# Altium footprint library 7-Connectors-9.PcbLib: 41 footprints (part 1 of 3) (continued)
## COME_NANO_NE [mm] (continued)
3D body "03-2.stp": height 0.02, standoff 0, extent 17.453,-19.299 17.753,-17.299
3D body "03-2.stp": height 0.02, standoff 0, extent 16.953,-19.299 17.253,-17.299
3D body "03-2.stp": height 0.02, standoff 0, extent 16.453,-19.299 16.753,-17.299
3D body "03-2.stp": height 0.02, standoff 0, extent 15.953,-19.299 16.253,-17.299
3D body "03-2.stp": height 0.02, standoff 0, extent 15.453,-19.299 15.753,-17.299
3D body "03-2.stp": height 0.02, standoff 0, extent 14.953,-19.299 15.253,-17.299
3D body "03-2.stp": height 0.02, standoff 0, extent 14.453,-19.299 14.753,-17.299
3D body "03-2.stp": height 0.02, standoff 0, extent 13.953,-19.299 14.253,-17.299
3D body "03-2.stp": height 0.02, standoff 0, extent 13.453,-19.299 13.753,-17.299
3D body "03-2.stp": height 0.02, standoff 0, extent 12.953,-19.299 13.253,-17.299
3D body "03-2.stp": height 0.02, standoff 0, extent 12.453,-19.299 12.753,-17.299
3D body "03-2.stp": height 0.02, standoff 0, extent 11.953,-19.299 12.253,-17.299
3D body "03-2.stp": height 0.02, standoff 0, extent 11.453,-19.299 11.753,-17.299
3D body "03-2.stp": height 0.02, standoff 0, extent 10.953,-19.299 11.253,-17.299
3D body "03-2.stp": height 0.02, standoff 0, extent 10.453,-19.299 10.753,-17.299
3D body "03-2.stp": height 0.02, standoff 0, extent 9.953,-19.299 10.253,-17.299
3D body "03-2.stp": height 0.02, standoff 0, extent 9.453,-19.299 9.753,-17.299
3D body "03-2.stp": height 0.02, standoff 0, extent 8.953,-19.299 9.253,-17.299
3D body "03-2.stp": height 0.02, standoff 0, extent 8.453,-19.299 8.753,-17.299
3D body "03-2.stp": height 0.02, standoff 0, extent 7.953,-19.299 8.253,-17.299
3D body "03-2.stp": height 0.02, standoff 0, extent 7.453,-19.299 7.753,-17.299
3D body "03-2.stp": height 0.02, standoff 0, extent 6.953,-19.299 7.253,-17.299
3D body "03-2.stp": height 0.02, standoff 0, extent 6.453,-19.299 6.753,-17.299
3D body "03-2.stp": height 0.02, standoff 0, extent 5.953,-19.299 6.253,-17.299
3D body "03-2.stp": height 0.02, standoff 0, extent 5.453,-19.299 5.753,-17.299
3D body "03-2.stp": height 0.02, standoff 0, extent 4.953,-19.299 5.253,-17.299
3D body "03-2.stp": height 0.02, standoff 0, extent 4.453,-19.299 4.753,-17.299
3D body "03-2.stp": height 0.02, standoff 0, extent 3.953,-19.299 4.253,-17.299
3D body "03-2.stp": height 0.02, standoff 0, extent 3.453,-19.299 3.753,-17.299
3D body "03-2.stp": height 0.02, standoff 0, extent 2.953,-19.299 3.253,-17.299
3D body "03-2.stp": height 0.02, standoff 0, extent 2.453,-19.299 2.753,-17.299
3D body "03-2.stp": height 0.02, standoff 0, extent 1.953,-19.299 2.253,-17.299
3D body "03-2.stp": height 0.02, standoff 0, extent 1.453,-19.299 1.753,-17.299
3D body "03-2.stp": height 0.02, standoff 0, extent 0.953,-19.299 1.253,-17.299
3D body "03-2.stp": height 0.02, standoff 0, extent 0.453,-19.299 0.753,-17.299
3D body "03-2.stp": height 0.02, standoff 0, extent -0.047,-19.299 0.253,-17.299
3D body "03-2.stp": height 0.02, standoff 0, extent -0.547,-19.299 -0.247,-17.299
3D body "03-2.stp": height 0.02, standoff 0, extent -1.047,-19.299 -0.747,-17.299
3D body "03-2.stp": height 0.02, standoff 0, extent -1.547,-19.299 -1.247,-17.299
3D body "03-2.stp": height 0.02, standoff 0, extent -2.047,-19.299 -1.747,-17.299
3D body "03-2.stp": height 0.02, standoff 0, extent -2.547,-19.299 -2.247,-17.299
3D body "03-2.stp": height 0.02, standoff 0, extent -3.047,-19.299 -2.747,-17.299
3D body "03-2.stp": height 0.02, standoff 0, extent -3.547,-19.299 -3.247,-17.299
3D body "03-2.stp": height 0.02, standoff 0, extent -4.047,-19.299 -3.747,-17.299
3D body "03-2.stp": height 0.02, standoff 0, extent -4.547,-19.299 -4.247,-17.299
3D body "03-2.stp": height 0.02, standoff 0, extent -5.047,-19.299 -4.747,-17.299
3D body "03-2.stp": height 0.02, standoff 0, extent -5.547,-19.299 -5.247,-17.299
3D body "03-2.stp": height 0.02, standoff 0, extent -6.047,-19.299 -5.747,-17.299
3D body "03-2.stp": height 0.02, standoff 0, extent -6.547,-19.299 -6.247,-17.299
3D body "03-2.stp": height 0.02, standoff 0, extent -7.047,-19.299 -6.747,-17.299
3D body "03-2.stp": height 0.02, standoff 0, extent -7.547,-19.299 -7.247,-17.299
3D body "03-2.stp": height 0.02, standoff 0, extent -8.047,-19.299 -7.747,-17.299
3D body "03-2.stp": height 0.02, standoff 0, extent -8.547,-19.299 -8.247,-17.299
3D body "03-2.stp": height 0.02, standoff 0, extent -9.047,-19.299 -8.747,-17.299
3D body "03-2.stp": height 0.02, standoff 0, extent -9.547,-19.299 -9.247,-17.299
3D body "03-2.stp": height 0.02, standoff 0, extent -10.047,-19.299 -9.747,-17.299
3D body "03-2.stp": height 0.02, standoff 0, extent -10.547,-19.299 -10.247,-17.299
3D body "03-2.stp": height 0.02, standoff 0, extent -11.047,-19.299 -10.747,-17.299
3D body "03-2.stp": height 0.02, standoff 0, extent -11.547,-19.299 -11.247,-17.299
3D body "03-2.stp": height 0.02, standoff 0, extent -12.047,-19.299 -11.747,-17.299
3D body "03-2.stp": height 0.02, standoff 0, extent -12.547,-19.299 -12.247,-17.299
3D body "03-2.stp": height 0.02, standoff 0, extent -13.047,-19.299 -12.747,-17.299
3D body "03-2.stp": height 0.02, standoff 0, extent -13.547,-19.299 -13.247,-17.299
3D body "03-2.stp": height 0.02, standoff 0, extent -14.047,-19.299 -13.747,-17.299
3D body "03-2.stp": height 0.02, standoff 0, extent -14.547,-19.299 -14.247,-17.299
3D body "03-2.stp": height 0.02, standoff 0, extent -15.047,-19.299 -14.747,-17.299
3D body "03-2.stp": height 0.02, standoff 0, extent -15.547,-19.299 -15.247,-17.299
3D body "03-2.stp": height 0.02, standoff 0, extent -16.047,-19.299 -15.747,-17.299
3D body "03-2.stp": height 0.02, standoff 0, extent -16.547,-19.299 -16.247,-17.299
3D body "03-2.stp": height 0.02, standoff 0, extent -17.047,-19.299 -16.747,-17.299
3D body "03-2.stp": height 0.02, standoff 0, extent -17.547,-19.299 -17.247,-17.299
3D body "03-2.stp": height 0.02, standoff 0, extent -18.047,-19.299 -17.747,-17.299
3D body "03-2.stp": height 0.02, standoff 0, extent -18.547,-19.299 -18.247,-17.299
3D body "03-2.stp": height 0.02, standoff 0, extent -19.047,-19.299 -18.747,-17.299
3D body "03-2.stp": height 0.02, standoff 0, extent -19.547,-19.299 -19.247,-17.299
3D body "03-2.stp": height 0.02, standoff 0, extent -20.047,-19.299 -19.747,-17.299
3D body "03-2.stp": height 0.02, standoff 0, extent -20.547,-19.299 -20.247,-17.299
3D body "03-2.stp": height 0.02, standoff 0, extent -21.047,-19.299 -20.747,-17.299
3D body "03-2.stp": height 0.02, standoff 0, extent -21.547,-19.299 -21.247,-17.299
3D body "03-2.stp": height 0.02, standoff 0, extent -22.047,-19.299 -21.747,-17.299
3D body "03-2.stp": height 0.02, standoff 0, extent -22.547,-19.299 -22.247,-17.299
3D body "03-2.stp": height 0.02, standoff 0, extent -23.047,-19.299 -22.747,-17.299
3D body "03-2.stp": height 0.02, standoff 0, extent -23.547,-19.299 -23.247,-17.299
3D body "03-2.stp": height 0.02, standoff 0, extent -24.047,-19.299 -23.747,-17.299
3D body "6-6-2_8.stp": height 0, standoff -2, extent 35,20.9 41,26.9
3D body "6-6-2_8.stp": height 0, standoff -2, extent -41,20.9 -35,26.9
3D body "6-6-2_8.stp": height 0, standoff -2, extent -41,-26.1 -35,-20.1
3D body "6-6-2_8.stp": height 0, standoff -2, extent 35,-26.1 41,-20.1

## CON_LCD_TFT1N4633_40 [mil] "CON_LCD_TFT1N4633_40"
height 433.07
pads (42):
  rect 12x48 smd: 1(-1340.91,-435.32) 2(-1321.22,-435.32) 3(-1301.54,-435.32) 4(-1281.85,-435.32) 5(-1262.17,-435.32) 6(-1242.48,-435.32) 7(-1222.8,-435.32) 8(-1203.11,-435.32) 9(-1183.43,-435.32) 10(-1163.74,-435.32) 11(-1144.06,-435.32) 12(-1124.37,-435.32) 13(-1104.69,-435.32) 14(-1085,-435.32) 15(-1065.32,-435.32) 16(-1045.63,-435.32) 17(-1025.95,-435.32) 18(-1006.26,-435.32) 19(-986.58,-435.32) 20(-966.89,-435.32) 21(-947.21,-435.32) 22(-927.52,-435.32) 23(-907.84,-435.32) 24(-888.15,-435.32) 25(-868.47,-435.32) 26(-848.78,-435.32) 27(-829.1,-435.32) 28(-809.41,-435.32) 29(-789.73,-435.32) 30(-770.04,-435.32) 31(-750.36,-435.32) 32(-730.67,-435.32) 33(-710.99,-435.32) 34(-691.3,-435.32) 35(-671.62,-435.32) 36(-651.93,-435.32) 37(-632.25,-435.32) 38(-612.56,-435.32) 39(-592.88,-435.32) 40(-573.19,-435.32)
  rect 115x115 smd: " "(-1423.87,-331.32) " "(-490.23,-331.32)
Top Overlay:
  circle w7.09: c-1371.85,-493.19 r9.85
  lines w7.09: -1447.6,-465.24 -1447.6,-234.14 -466.5,-234.14 -466.5,-465.24 -1447.6,-465.24
Bottom Overlay:
  lines w11.81: -2085,-1254.22 -2085,-1332.96 -1990.52,-1332.96 ; -2085,1222.16 -2085,1296.96 -2002.33,1296.96 ; 2001.61,1296.96 2080.35,1296.96 2080.35,1226.1 ; 2013.42,-1332.96 2080.35,-1332.96 2080.35,-1258.15
Keep-Out Layer:
  lines w1: -1982.64,1409.17 -1982.64,1153.26 773.26,1153.26 773.26,1409.17
Mechanical 6:
  lines w11.81: -2085,-1254.22 -2085,-1332.96 -1990.52,-1332.96 ; -2085,1222.16 -2085,1296.96 -2002.33,1296.96 ; 2001.61,1296.96 2080.35,1296.96 2080.35,1226.1 ; 2013.42,-1332.96 2080.35,-1332.96 2080.35,-1258.15
Mechanical 7:
  circle w7.09: c-1371.85,-493.19 r9.85
  lines w7.09: -1447.6,-400.24 -1447.6,-465.24 -1358.33,-465.24 ; -1447.6,-262.41 -1447.6,-234.14 -466.5,-234.14 -466.5,-262.41 ; -555.78,-465.24 -466.5,-465.24 -466.5,-400.24
Mechanical 8:
  lines w1: -1431.46,25.31 -1431.46,198.93 ; -1419.65,41.06 -1419.65,153.66 ; -1411.78,184.17 -1431.46,189.09 ; -1411.78,194.01 -1431.46,189.09 ; -1405.87,3.66 -1405.87,112.31 ; -1399.97,138.89 -1419.65,143.81 ; -1399.97,148.73 -1419.65,143.81 ; -1386.19,97.55 -1405.87,102.46 ; -1386.19,107.4 -1405.87,102.46 ; -1340.91,-281.38 -1340.91,-169.57 ; -1321.22,-276.46 -1340.91,-271.54 ; -1321.22,-266.62 -1340.91,-271.54 ; -691.3,-232.76 -671.62,-227.84 ; -691.3,-222.93 -671.62,-227.84 ; -671.62,-237.69 -671.62,-169.57 ; -651.93,-237.69 -651.93,-169.57 ; -632.25,-232.76 -651.93,-227.84 ; -632.25,-222.93 -651.93,-227.84 ; -592.88,-276.46 -573.19,-271.54 ; -592.88,-266.62 -573.19,-271.54 ; -573.19,-281.38 -573.19,-169.57 ; -563.35,-159.73 -422.41,-159.73 ; -562.17,-205.79 -560.6,69.8 -559.6,41.78 -558.63,555.23 676.81,555.23 676.81,1262.32 -1352.72,1262.32 -1352.72,-205.79 -560.6,-205.79 ; -559.41,-173.51 -364.14,-173.51 ; -527.93,97.55 -508.23,102.46 ; -527.93,107.4 -508.23,102.46 ; -514.14,138.89 -494.45,143.81 ; -514.14,148.73 -494.45,143.81 ; -508.23,3.66 -508.23,112.31 ; -502.33,184.17 -482.64,189.09 ; -502.33,194.01 -482.64,189.09 ; -498.39,-6.19 -422.41,-6.19 ; -494.45,41.06 -494.45,153.66 ; -484.61,31.2 -364.14,31.2 ; -482.64,25.31 -482.64,198.93 ; -437.17,-140.04 -432.25,-159.73 ; -437.17,-25.87 -432.25,-6.19 ; -427.33,-140.04 -432.25,-159.73 ; -427.33,-25.87 -432.25,-6.19 ; -378.9,-153.82 -373.98,-173.51 ; -378.9,11.53 -373.98,31.2 ; -369.06,-153.82 -373.98,-173.51 ; -369.06,11.53 -373.98,31.2 ; -1431.46,189.09 -942.48,189.09 -482.64,189.09 ; -1419.65,143.81 -943.27,143.81 -494.45,143.81 ; -1405.87,102.46 -940.91,102.46 -508.23,102.46 ; -1340.91,-271.54 -935,-271.54 -573.19,-271.54 ; -671.62,-227.84 -661.78,-227.84 -651.93,-227.84 ; -432.25,-159.73 -432.25,-90.44 -432.25,-6.19 ; -373.98,-173.51 -373.98,-71.15 -373.98,31.2
  text "0.5" at -636.19,-237.69 h25
  text "3.9" at -422.41,-64.85 h25
  text "5.2" at -364.14,-45.56 h25
  text "19.5" at -900.06,-281.38 h25
  text "22.8" at -905.97,92.63 h25
  text "23.5" at -908.33,133.97 h25
  text "24.1" at -907.54,179.25 h25
Mechanical 16:
  drawing of 196 lines, arcs and shapes, not listed
Multi-Layer:
  pour cut-out: 792.94,1271.37 792.94,1428.85 -2002.33,1428.85 -2002.33,1271.37
Mechanical 18:
  text "34" at -710.2,-435.32 h23.62
  text "3" at -1310.99,-435.32 h23.62
  text "29" at -808.63,-435.32 h23.62
  text "36" at -670.83,-435.32 h23.62
  text "4" at -1291.3,-435.32 h23.62
  text "1" at -1350.36,-435.32 h23.62
  text "2" at -1330.67,-435.32 h23.62
  text "23" at -926.74,-435.32 h23.62
  text "30" at -788.94,-435.32 h23.62
  text "35" at -690.52,-435.32 h23.62
  text "25" at -887.37,-435.32 h23.62
  text "20" at -985.79,-435.32 h23.62
  text "26" at -867.68,-435.32 h23.62
  text "39" at -611.78,-435.32 h23.62
  text "11" at -1162.96,-435.32 h23.62
  text "7" at -1232.25,-435.32 h23.62
  text "8" at -1212.56,-435.32 h23.62
  text "6" at -1251.93,-435.32 h23.62
  text "5" at -1271.62,-435.32 h23.62
  text "18" at -1025.16,-435.32 h23.62
  text "17" at -1044.85,-435.32 h23.62
  text "37" at -651.15,-435.32 h23.62
  text "15" at -1084.22,-435.32 h23.62
  text "16" at -1064.53,-435.32 h23.62
  text "14" at -1103.9,-435.32 h23.62
  text "13" at -1123.59,-435.32 h23.62
  text "10" at -1182.64,-435.32 h23.62
  text "38" at -631.46,-435.32 h23.62
  text "9" at -1192.88,-435.32 h23.62
  text "12" at -1143.27,-435.32 h23.62
  text "28" at -828.31,-435.32 h23.62
  text "40" at -592.09,-435.32 h23.62
  text "22" at -946.42,-435.32 h23.62
  text "24" at -907.05,-435.32 h23.62
  text "19" at -1005.48,-435.32 h23.62
  text "21" at -966.11,-435.32 h23.62
  text "27" at -848,-435.32 h23.62
  text "31" at -769.26,-435.32 h23.62
  text "32" at -749.57,-435.32 h23.62
  text "33" at -729.89,-435.32 h23.62
Mechanical 21:
  text "FPC_top_40pins" at -1116.49,-397.52 h23.62
  text "TOLERANCE" at -1095.23,-395.95 h23.62
  text "PARTNUM" at -1051.13,-397.52 h23.62
  text "1" at -1358.24,-485.87 h43.31
Mechanical 24:
  text "NAME: CON_OMRON_XF2M40151A_40PTS_ZIF" at -650.95,234.96 h25
  text "PAD : 0mm25x1mm1 1mm5x1mm7" at -650.95,264.48 h25
  text "HGT : 2mm0 3mm1 ouvert" at -650.95,294.01 h25
  text "DOC : OMRON" at -650.95,323.54 h25

## CON_SAMTEC_TSM_115_01_DV_A [mm] "CON_SAMTEC_TSM_115_01_DV_A"
height 11
pads (32):
  rect 1.27x3.17 smd: 1(-17.78,-2.73) 2(-17.78,2.73) 3(-15.24,-2.73) 4(-15.24,2.73) 5(-12.7,-2.73) 6(-12.7,2.73) 7(-10.16,-2.73) 8(-10.16,2.73) 9(-7.62,-2.73) 10(-7.62,2.73) 11(-5.08,-2.73) 12(-5.08,2.73) 13(-2.54,-2.73) 14(-2.54,2.73) 15(0,-2.73) 16(0,2.73) 17(2.54,-2.73) 18(2.54,2.73) 19(5.08,-2.73) 20(5.08,2.73) 21(7.62,-2.73) 22(7.62,2.73) 23(10.16,-2.73) 24(10.16,2.73) 25(12.7,-2.73) 26(12.7,2.73) 27(15.24,-2.73) 28(15.24,2.73) 29(17.78,-2.73) 30(17.78,2.73)
  round 1 / inner round 1.78 / far side round 1 hole 1.78: " "(-16.51,0) " "(16.51,0)
Top Overlay:
  lines w0.18: -19.05,-4.64 19.05,-4.64 19.05,4.64 -19.05,4.64 -19.04,-4.64 ; -18.499,-4.689 -17.864,-5.642 -17.229,-4.689
  text "1" at -19.37,-2.15 h1.2
  text "2" at -19.12,5.1 h1.2
  text "29" at 21.36,-2.15 h1.2
  text "30" at 21.36,3.85 h1.2
Top Solder:
  pour cut-out: 15.35,0 15.39,-0.3 15.505,-0.58 15.69,-0.82 15.93,-1.005 16.21,-1.12 16.51,-1.16 16.81,-1.12 17.09,-1.005 17.33,-0.82 17.515,-0.58 17.63,-0.3 17.67,0 17.63,0.3 17.515,0.58 17.33,0.82 17.09,1.005 16.81,1.12 16.51,1.16 16.21,1.12 15.93,1.005 15.69,0.82 15.505,0.58 15.39,0.3
  pour cut-out: -17.67,0 -17.63,-0.3 -17.515,-0.58 -17.33,-0.82 -17.09,-1.005 -16.81,-1.12 -16.51,-1.16 -16.21,-1.12 -15.93,-1.005 -15.69,-0.82 -15.505,-0.58 -15.39,-0.3 -15.35,0 -15.39,0.3 -15.505,0.58 -15.69,0.82 -15.93,1.005 -16.21,1.12 -16.51,1.16 -16.81,1.12 -17.09,1.005 -17.33,0.82 -17.515,0.58 -17.63,0.3
Bottom Solder:
  pour cut-out: 15.35,0 15.39,-0.3 15.505,-0.58 15.69,-0.82 15.93,-1.005 16.21,-1.12 16.51,-1.16 16.81,-1.12 17.09,-1.005 17.33,-0.82 17.515,-0.58 17.63,-0.3 17.67,0 17.63,0.3 17.515,0.58 17.33,0.82 17.09,1.005 16.81,1.12 16.51,1.16 16.21,1.12 15.93,1.005 15.69,0.82 15.505,0.58 15.39,0.3
  pour cut-out: -17.67,0 -17.63,-0.3 -17.515,-0.58 -17.33,-0.82 -17.09,-1.005 -16.81,-1.12 -16.51,-1.16 -16.21,-1.12 -15.93,-1.005 -15.69,-0.82 -15.505,-0.58 -15.39,-0.3 -15.35,0 -15.39,0.3 -15.505,0.58 -15.69,0.82 -15.93,1.005 -16.21,1.12 -16.51,1.16 -16.81,1.12 -17.09,1.005 -17.33,0.82 -17.515,0.58 -17.63,0.3
Mechanical 6:
  lines w0.18: -19.05,-4.64 19.05,-4.64 19.05,4.64 -19.05,4.64 -19.04,-4.64 ; -18.499,-4.689 -17.864,-5.642 -17.229,-4.689
  text "30" at 21.36,3.85 h1.2
  text "29" at 21.36,-2.15 h1.2
  text "2" at -19.12,5.1 h1.2
  text "1" at -19.37,-2.15 h1.2
Mechanical 8:
  lines w0.025: -23.96,-2.73 -18.03,-2.73 ; -23.96,2.73 -18.03,2.73 ; -23.835,-2.23 -23.71,-2.73 ; -23.835,2.23 -23.71,2.73 ; -23.585,-2.23 -23.71,-2.73 ; -23.585,2.23 -23.71,2.73 ; -20.99,-2.54 -19.3,-2.54 ; -20.99,2.54 -19.3,2.54 ; -20.865,-2.04 -20.74,-2.54 ; -20.865,2.04 -20.74,2.54 ; -20.615,-2.04 -20.74,-2.54 ; -20.615,2.04 -20.74,2.54 ; -19.05,2.79 -19.05,8.78 ; -18.55,8.405 -19.05,8.53 ; -18.55,8.655 -19.05,8.53 ; -17.78,2.98 -17.78,7.13 ; -17.28,6.755 -17.78,6.88 ; -17.28,7.005 -17.78,6.88 ; -16.51,0.25 -16.51,5.87 ; -16.01,5.495 -16.51,5.62 ; -16.01,5.745 -16.51,5.62 ; -15.74,6.755 -15.24,6.88 ; -15.74,7.005 -15.24,6.88 ; -15.24,2.98 -15.24,7.13 ; 16.01,5.495 16.51,5.62 ; 16.01,5.745 16.51,5.62 ; 16.51,0.25 16.51,5.87 ; 18.55,8.405 19.05,8.53 ; 18.55,8.655 19.05,8.53 ; 19.05,2.79 19.05,8.78 ; -23.71,-2.73 -23.71,-0.06 -23.71,2.73 ; -20.74,-2.54 -20.74,0.02 -20.74,2.54 ; -19.05,8.53 0.42,8.53 19.05,8.53 ; -17.78,6.88 -16.43,6.88 -15.24,6.88 ; -16.51,5.62 -0.15,5.62 16.51,5.62
  text "2.54" at -17.317,7.13 h0.5
  text "5.46" at -23.96,-0.948 h0.5
  text "5.08" at -20.99,-0.867 h0.5
  text "38.1" at -0.467,8.78 h0.5
  text "33.02" at -1.275,5.87 h0.5
Mechanical 16:
  drawing of 1039 lines, arcs and shapes, not listed
Multi-Layer keep-out:
  circle w0.025: c-16.51,0 r1.2
  circle w0.025: c16.51,0 r1.2
Mechanical 18:
  text "1" at -17.58,-0.93 h0.5
  text "30" at 18.18,0.53 h0.5
  text "4" at -15.04,0.53 h0.5
  text "17" at 2.94,-0.93 h0.5
  text "15" at 0.4,-0.93 h0.5
  text "13" at -2.14,-0.93 h0.5
  text "11" at -4.68,-0.93 h0.5
  text "9" at -7.42,-0.93 h0.5
  text "2" at -17.58,0.53 h0.5
  text "14" at -2.14,0.53 h0.5
  text "12" at -4.68,0.53 h0.5
  text "10" at -7.22,0.53 h0.5
  text "29" at 18.18,-0.93 h0.5
  text "28" at 15.64,0.53 h0.5
  text "27" at 15.64,-0.93 h0.5
  text "26" at 13.1,0.53 h0.5
  text "25" at 13.1,-0.93 h0.5
  text "24" at 10.56,0.53 h0.5
  text "23" at 10.56,-0.93 h0.5
  text "22" at 8.02,0.53 h0.5
  text "21" at 8.02,-0.93 h0.5
  text "20" at 5.48,0.53 h0.5
  text "19" at 5.48,-0.93 h0.5
  text "18" at 2.94,0.53 h0.5
  text "16" at 0.4,0.53 h0.5
  text "8" at -9.96,0.53 h0.5
  text "6" at -12.5,0.53 h0.5
  text "7" at -9.96,-0.93 h0.5
  text "5" at -12.5,-0.93 h0.5
  text "3" at -15.04,-0.93 h0.5
Mechanical 20:
  text "HDR_2x15_SMT" at 4.84,-0.95 h1.8
  text "TOLERANCE" at 6.48,-0.99 h1.8
  text "PARTNUM" at 5.04,-0.95 h1.8
  text ".Designator" at -0.559,0.7 h1.12
  text "1" at -18.353,-3.5 h1.12
  text "2" at -18.453,4.5 h1.12
  text "29" at 21.394,-1.25 h1.12
  text "30" at 21.444,2.5 h1.12
Mechanical 24:
  text "NAME: CON_SAMTEC_TSM_115_01_DV_A" at -9.865,-6.24 h0.5
  text "PAD : 1mm27x3mm17;tnm1mm78_01 (1.78 +0.08 -0.00)" at -9.865,-6.99 h0.5
  text "HGT : 9mm65" at -9.865,-7.74 h0.5
  text "DOC : SAMTEC" at -9.865,-8.49 h0.5

## DD JTAG [mm]
height 11
pads (7):
  rect 0.65x1.3 smd: 1(2,0) 2(1,0) 3(0,0) 4(-1,0) 5(-2,0)
  rect 0.65x3.5 smd: #(-2.921,-3.048) #(2.921,-3.048)
Top Overlay:
  lines w0.127: -3.5,-5.5 -3.5,-0.7 3.5,-0.7 3.5,-5.5 -3.5,-5.5

## DF13A-2X15X1.25 [mm]
height 11
pads (32):
  rect 0.6x1.9 smd mask+0.07: 1(-8.763,3.086) 2(-8.75,-3.086) 3(-7.5,3.086) 4(-7.5,-3.086) 5/nc(-6.25,3.086) 6/nc(-6.25,-3.086) 7/nc(-5,3.086) 8/nc(-5,-3.086) 9(-3.75,3.086) 10(-3.75,-3.086) 11(-2.5,3.086) 12(-2.5,-3.086) 13(-1.25,3.086) 14(-1.25,-3.086) 15(0,3.086) 16(0,-3.086) 17(1.25,3.086) 18(1.25,-3.086) 19(2.5,3.086) 20(2.5,-3.086) 21(3.75,3.086) 22(3.75,-3.086) 23/nc(5,3.086) 24/nc(5,-3.086) 25/nc(6.25,3.086) 26/nc(6.25,-3.086) 27/nc(7.5,3.086) 28/nc(7.5,-3.086) 29/nc(8.75,3.086) 30/nc(8.75,-3.086)
  rect 2.2x2.2 smd mask+0.07: ID#(-11.62,0)
  rect 2.2x2.2 smd: ID#(11.608,0)
Mechanical 15:
  lines w0.02: -13.672,3.85 13.125,3.85 ; -13.507,-3.85 13.29,-3.85 ; -13.113,0 13.684,0 ; -12.973,-2.15 13.824,-2.15 ; -12.872,2.15 13.925,2.15 ; -10.6,-4.009 -10.6,4.716 ; 0,-3.996 0,4.729 ; 10.6,-4.174 10.6,4.551
  lines w0.254: -0.4,-0.013 0.4,-0.013 ; 0,-0.4 0,0.4 ; -12.3,-3.45 12.3,-3.45 12.3,3.45 -12.3,3.45 -12.3,-3.45

## E-RS232J [mil]
height 700.79
pads (11):
  rect 10.5x40 smd mask+2: 1(-62.99,-76) 2(-47.24,-76) 3(-31.5,-76) 4(-15.75,-76) 5(0,-76) 6(15.75,-76) 7(31.5,-76) 8(47.24,-76) 9(62.99,-76)
  rect 65x49 smd mask+2: 10(169.29,0) 11(-169.29,0)
Top Overlay:
  lines w0.2: -135,-49 -135,35 135,35 135,-49 -135,-49

## EA_WF100-04S [mm] "4 Contact Picth 1mm, ZIF Connector For Touch Panel"
height 3
pads (6):
  rect 0.6x1.85 smd: 1(1.5,0) 2(0.5,0) 3(-0.5,0) 4(-1.5,0)
  rect 2.1x4.3 smd: 5(-4.95,-3.075) 6(4.95,-3.075)
Top Overlay:
  lines w0.2: -2.1,-0.325 -5.7,-0.325 -5.7,-6.125 5.7,-6.125 5.7,-0.325 2.1,-0.325
Mechanical 8:
  lines w0.1: -5.45,-3.075 -4.95,-3.075 ; -4.95,-3.575 -4.95,-3.075 ; -4.95,-2.575 -4.95,-3.075 ; -4.45,-3.075 -4.95,-3.075 ; -2,0 -1.5,0 ; -1.5,-0.5 -1.5,0 ; -1.5,0.5 -1.5,0 ; -1,0 -0.5,0 ; -0.5,-0.5 -0.5,0 ; -0.5,0.5 -0.5,0 ; 0,-0.5 0,0 ; 0,0.5 0,0 ; 0.5,-0.5 0.5,0 ; 0.5,0.5 0.5,0 ; 1,0 0.5,0 ; 1.5,-0.5 1.5,0 ; 1.5,0.5 1.5,0 ; 2,0 1.5,0 ; 4.45,-3.075 4.95,-3.075 ; 4.95,-3.575 4.95,-3.075 ; 4.95,-2.575 4.95,-3.075 ; 5.45,-3.075 4.95,-3.075 ; -0.5,0 0,0 ; 0,0 0.5,0 ; -6,-5.225 -6,-0.925 -3.9,-0.925 -3.9,-5.225 -6,-5.225 ; -1.8,-0.925 -1.8,0.925 -1.2,0.925 -1.2,-0.925 -1.8,-0.925 ; -0.8,-0.925 -0.8,0.925 -0.2,0.925 -0.2,-0.925 -0.8,-0.925 ; 0.2,-0.925 0.2,0.925 0.8,0.925 0.8,-0.925 0.2,-0.925 ; 1.2,-0.925 1.2,0.925 1.8,0.925 1.8,-0.925 1.2,-0.925 ; 3.9,-5.225 6,-5.225 6,-0.925 3.9,-0.925 3.9,-5.225
Mechanical 14:
  lines w0.1: -5.7,-6.125 -5.7,-0.325 5.7,-0.325 5.7,-6.125 -5.7,-6.125
Mechanical 15:
  lines w0.1: -6.25,-6.375 6.25,-6.375 6.25,1.175 -6.25,1.175 -6.25,-6.375
3D body: height 3, standoff 0, extent -5.7,-6.125 5.7,-0.325

## EDGE26T2B1_P254W3550L1020F140X1000 [mm] "26 contacts Board Eddge Connector, First Left Top Pad 2, First Left Bottom Pad 1Pitch 2.54mm Length 35.5mm, Width 10.2mm, Finger Lenght 10mm, Finger Witdth 1.4mm"
height 3
pads (26):
  rect 1.4x10 smd far side: 1(2.51,5.5) 3(5.05,5.5) 5(7.59,5.5) 7(10.13,5.5) 9(12.67,5.5) 11(15.21,5.5) 13(17.75,5.5) 15(20.29,5.5) 17(22.83,5.5) 19(25.37,5.5) 21(27.91,5.5) 23(30.45,5.5) 25(32.99,5.5)
  rect 1.4x10 smd: 2(2.51,5.5) 4(5.05,5.5) 6(7.59,5.5) 8(10.13,5.5) 10(12.67,5.5) 12(15.21,5.5) 14(17.75,5.5) 16(20.29,5.5) 18(22.83,5.5) 20(25.37,5.5) 22(27.91,5.5) 24(30.45,5.5) 26(32.99,5.5)
Top Overlay:
  text "26" at 33.58,11.225 h1.2
  text "2" at 3.1,11.225 h1.2
Bottom Overlay:
  text "25" at 32.38,11.35 h1.2
  text "1" at 1.9,11.35 h1.2
Top Solder:
  rectangle: 0,-2.275 35.5,10.5
  lines w2.54: -4.425,-1 32.99,-1
Bottom Solder:
  rectangle: 0,-2.275 35.5,10.5
  lines w2.54: -4.425,-1 32.99,-1
Keep-Out Layer:
  lines w0.305: -2.4,10.2 -1,10.2 cw(c-1,9.2) 0,9.2 0,1 ccw(c1,1) 1,0 34.5,0 ccw(c34.5,1) 35.5,1 35.5,9.2 cw(c36.5,9.2) 36.5,10.2 37.9,10.2
Mechanical 1:
  lines w1.27: -2.4,10.2 -1,10.2 cw(c-1,9.2) 0,9.2 0,1 ccw(c1,1) 1,0 34.5,0 ccw(c34.5,1) 35.5,1 35.5,9.2 cw(c36.5,9.2) 36.5,10.2 37.9,10.2
Mechanical 5:
  lines w0.1: -5,0 0,0 0,-5 ; 35.5,-5 35.5,0 40.5,0
Mechanical 8:
  lines w0.1: -5,0 0,0 0,-5 ; -5,10.2 -1,10.2 ; -3.8,0 -2.4,0 ; -3.8,10.2 -2.4,10.2 ; -2.742,0.94 -2.4,0 ; -2.742,9.26 -2.4,10.2 ; -2.058,0.94 -2.4,0 ; -2.058,9.26 -2.4,10.2 ; -1,0 -2.4,0 ; 0.94,8.458 0,8.8 ; 0.94,9.142 0,8.8 ; 34.56,8.458 35.5,8.8 ; 34.56,9.142 35.5,8.8 ; 35.5,-5 35.5,0 40.5,0 ; 40.5,10.2 36.5,10.2 ccw(c36.5,9.2) 35.5,9.2 ; -2.4,0 -2.4,10.2 ; -2.4,10.2 -1,10.2 ; -1,10.2 cw(c-1,9.2) 0,9.2 ; 0,8.8 0,9.2 ; 0,8.8 35.5,8.8 ; 0,9.2 0,1 ccw(c1,1) 1,0 34.5,0 ccw(c34.5,1) 35.5,1 35.5,9.2 ; 2.51,5.5 2.51,6 2.51,5.5 ; 2.51,5.5 2.51,5 2.51,5.5 ; 2.51,5.5 3.01,5.5 2.51,5.5 ; 2.51,5.5 2.01,5.5 2.51,5.5 ; 5.05,5.5 5.05,6 5.05,5.5 ; 5.05,5.5 5.05,5 5.05,5.5 ; 5.05,5.5 5.55,5.5 5.05,5.5 ; 5.05,5.5 4.55,5.5 5.05,5.5 ; 7.59,5.5 7.59,6 7.59,5.5 ; 7.59,5.5 7.59,5 7.59,5.5 ; 7.59,5.5 8.09,5.5 7.59,5.5 ; 7.59,5.5 7.09,5.5 7.59,5.5 ; 10.13,5.5 10.13,6 10.13,5.5 ; 10.13,5.5 10.13,5 10.13,5.5 ; 10.13,5.5 10.63,5.5 10.13,5.5 ; 10.13,5.5 9.63,5.5 10.13,5.5 ; 12.67,5.5 12.67,6 12.67,5.5 ; 12.67,5.5 12.67,5 12.67,5.5 ; 12.67,5.5 13.17,5.5 12.67,5.5 ; 12.67,5.5 12.17,5.5 12.67,5.5 ; 15.21,5.5 15.21,6 15.21,5.5 ; 15.21,5.5 15.21,5 15.21,5.5 ; 15.21,5.5 15.71,5.5 15.21,5.5 ; 15.21,5.5 14.71,5.5 15.21,5.5 ; 17.75,5.5 17.75,6 17.75,5.5 ; 17.75,5.5 17.75,5 17.75,5.5 ; 17.75,5.5 18.25,5.5 17.75,5.5 ; 17.75,5.5 17.25,5.5 17.75,5.5 ; 20.29,5.5 20.29,6 20.29,5.5 ; 20.29,5.5 20.29,5 20.29,5.5 ; 20.29,5.5 20.79,5.5 20.29,5.5 ; 20.29,5.5 19.79,5.5 20.29,5.5 ; 22.83,5.5 22.83,6 22.83,5.5 ; 22.83,5.5 22.83,5 22.83,5.5 ; 22.83,5.5 23.33,5.5 22.83,5.5 ; 22.83,5.5 22.33,5.5 22.83,5.5 ; 25.37,5.5 25.37,6 25.37,5.5 ; 25.37,5.5 25.37,5 25.37,5.5 ; 25.37,5.5 25.87,5.5 25.37,5.5 ; 25.37,5.5 24.87,5.5 25.37,5.5 ; 27.91,5.5 27.91,6 27.91,5.5 ; 27.91,5.5 27.91,5 27.91,5.5 ; 27.91,5.5 28.41,5.5 27.91,5.5 ; 27.91,5.5 27.41,5.5 27.91,5.5 ; 30.45,5.5 30.45,6 30.45,5.5 ; 30.45,5.5 30.45,5 30.45,5.5 ; 30.45,5.5 30.95,5.5 30.45,5.5 ; 30.45,5.5 29.95,5.5 30.45,5.5 ; 32.99,5.5 32.99,6 32.99,5.5 ; 32.99,5.5 32.99,5 32.99,5.5 ; 32.99,5.5 33.49,5.5 32.99,5.5 ; 32.99,5.5 32.49,5.5 32.99,5.5 ; 35.5,8.8 35.5,9.2
  text "35.5mm" at 15.3,9.45 h1.2
  text "10.2mm" at -3.125,1.425 h1.2
  text "All Pads  W 1.4mm x L 10mm" at 4.5,6.85 h1.2
Mechanical 10:
  lines w0.305: 2.51,-1 2.51,5.5 ; 5.05,-1 5.05,5.5 ; 7.59,-1 7.59,5.5 ; 10.13,-1 10.13,5.5 ; 12.67,-1 12.67,5.5 ; 15.21,-1 15.21,5.5 ; 17.75,-1 17.75,5.5 ; 20.29,-1 20.29,5.5 ; 22.83,-1 22.83,5.5 ; 25.37,-1 25.37,5.5 ; 27.91,-1 27.91,5.5 ; 30.45,-1 30.45,5.5 ; 32.99,-1 32.99,5.5
  lines w2.54: -4.425,-1 32.99,-1
Drill Drawing:
  lines w0.1: -2.4,10.2 -1,10.2 cw(c-1,9.2) 0,9.2 0,7.8 ; 0,1 ccw(c1,1) 1,0 ; 18.125,1.737 33.762,1.737 35.25,0.25 ; 34.344,0.673 35.25,0.25 ; 34.5,0 ccw(c34.5,1) 35.5,1 ; 34.827,1.156 35.25,0.25 ; 35.5,7.8 35.5,9.2 cw(c36.5,9.2) 36.5,10.2 37.9,10.2
  text "4 x r = 1mm max" at 17.7,2.25 h1.2

## FPC 1.0_6P [mm]
height 12.3
pads (8):
  rect 0.61x2 smd mask+0.07: 1(2.5,1.4) 2(1.5,1.4) 3(0.5,1.4) 4(-0.5,1.4) 5(-1.5,1.4) 6(-2.5,1.4)
  rect 2.5x3.6 smd mask+0.07: ID#(-5.396,-1.4)
  rect 2.5x3.6 smd: ID#(5.396,-1.394)
Top Overlay:
  lines w0.254: -3.435,0.584 -6.858,0.584 -6.858,-3.404 6.833,-3.404 6.833,0.584 3.41,0.584